# Altium footprint library chipfc_extras_footprint.PCBLIB: 86 footprints (part 6 of 6)
Each footprint in its own frame and in the unit in brackets; x right, y up, seen from the top. Pads: shape width x height; smd on the part's side, far side on the other; paste and mask are expansions set on the pad; w line width, h text height; cw(c..) or ccw(c..) is an arc to the next point about the centre after c.
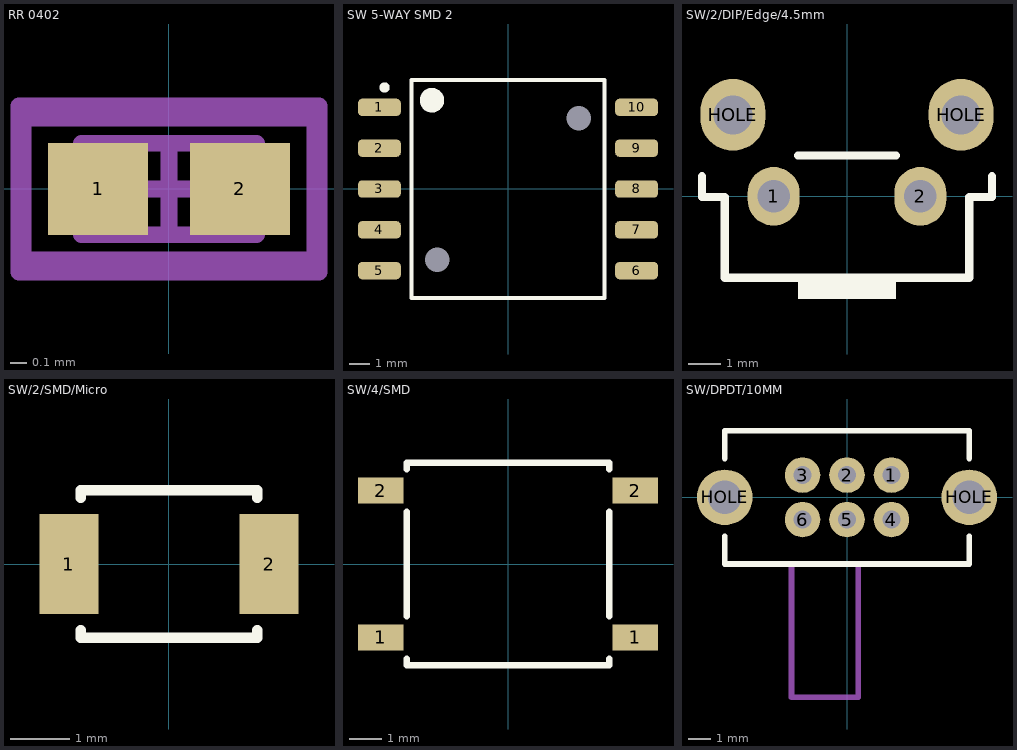
[diagram p5: the footprints below, top view; thin cyan lines are the x and y axes]

## RR 0402 [mm] "Chip Capacitor, 2-Leads, Body 1.0x0.5mm, IPC Medium Density"
height 0.55
pads (2):
  rect 0.6x0.55 smd: 1(-0.425,0) 2(0.425,0)
Mechanical 13:
  lines w0.1: -0.525,-0.275 0.525,-0.275 0.525,0.275 -0.525,0.275 -0.525,-0.275
Mechanical 15:
  lines w0.1: -0.275,0 0.275,0 ; 0,-0.275 0,0.275 ; -0.875,-0.425 0.875,-0.425 0.875,0.425 -0.875,0.425 -0.875,-0.425
Mechanical 31:
  lines w0.1: -0.9,-0.5 0.9,-0.5 0.9,0.5 -0.9,0.5 -0.9,-0.5
3D body "User Library-Chip Resistor2 (1).step": height 0.4, standoff 0, extent -0.5,-0.25 0.5,0.25

## SW 5-WAY SMD 2 [mm]
height 5
pads (12):
  rrect50% 2.1x0.85 smd: 1(-6.3,4) 2(-6.3,2) 3(-6.3,0) 4(-6.3,-2) 5(-6.3,-4) 6(6.3,-4) 7(6.3,-2) 8(6.3,0) 9(6.3,2) 10(6.3,4)
  round 0 hole 1.2: HOLE(-3.465,-3.465) HOLE(3.465,3.465)
Top Overlay:
  circle w0.25: c-6.05,4.975 r0.125
  circle w0.6: c-3.725,4.35 r0.3
  lines w0.2: -4.725,-5.35 -4.725,5.35 4.725,5.35 4.725,-5.35 -4.725,-5.35
3D body: height 5, standoff 0.1, extent -5,-5.35 5,5.35

## SW/2/DIP/Edge/4.5mm [mm]
pads (4):
  oval 1.6x1.8 hole 1: 1(-2.25,0) 2(2.25,0)
  oval 2x2.2 hole 1.2: HOLE(-3.5,2.5) HOLE(3.5,2.5)
Top Overlay:
  rectangle: -1.5,-3.15 1.5,-2.5
  lines w0.254: -4.445,0.615 -4.445,-0.02 -3.75,-0.02 -3.75,-2.5 3.75,-2.5 3.75,-0.02 4.445,-0.02 4.445,0.615 ; -1.5,1.25 1.5,1.25
3D body "User Library-SWITCH, TACTILE, RIGHT ANGLE, 12VDC, 50MA, 3_15MM ACTUATOR, WEALTH METAL TC-0240Z.step": height 7, standoff -4, extent -3.7,-3.15 3.7,4.15

## SW/2/SMD/Micro [mm]
pads (2):
  rect 1x1.7 smd: 1(-1.7,0) 2(1.7,0)
Top Overlay:
  lines w0.178: -1.5,-1.125 -1.5,-1.25 1.5,-1.25 1.5,-1.125 ; -1.5,1.125 -1.5,1.25 1.5,1.25 1.5,1.125
3D body: height 1.2, standoff 0, extent -1.5,-1.25 1.5,1.25
3D body: height 1.6, standoff 0, extent -0.744,-0.748 0.75,0.749

## SW/4/SMD [mm]
pads (4):
  rect 1.4x0.8 smd: 1(-3.9,-2.25) 1(3.9,-2.25) 2(-3.9,2.25) 2(3.9,2.25)
Top Overlay:
  lines w0.203: -3.1,-2.9 -3.1,-3.1 3.1,-3.1 3.1,-2.9 ; -3.1,-1.6 -3.1,1.6 ; -3.1,2.9 -3.1,3.1 3.1,3.1 3.1,2.9 ; 3.1,-1.6 3.1,1.6
3D body "User Library-PTS645SL70SMTR92-LFS.STEP": height 7, standoff 0, extent -4.5,-3 4.5,3

## SW/DPDT/10MM [mm]
pads (8):
  round 1.6 hole 0.8: 1(2,1) 2(0,1) 3(-2,1) 4(2,-1) 5(0,-1) 6(-2,-1)
  round 2.5 hole 1.5: HOLE(-5.5,0) HOLE(5.5,0)
Top Overlay:
  lines w0.254: -5.5,-1.75 -5.5,-3 5.5,-3 5.5,-1.75 ; -5.5,1.75 -5.5,3 5.5,3 5.5,1.75
Mechanical 1:
  lines w0.254: -2.5,-3 -2.5,-9 0.5,-9 0.5,-3
3D body: height 5, standoff 0, extent -5.5,-3 5.5,3
3D body: height 4.5, standoff 1.5, extent -2.5,-9 0.5,-3